# Altium footprint library ICs And Semiconductors THD.PcbLib: 292 footprints (part 15 of 19)
Each footprint in its own frame and in the unit in brackets; x right, y up, seen from the top. Pads: shape width x height; smd on the part's side, far side on the other; paste and mask are expansions set on the pad; w line width, h text height; cw(c..) or ccw(c..) is an arc to the next point about the centre after c.
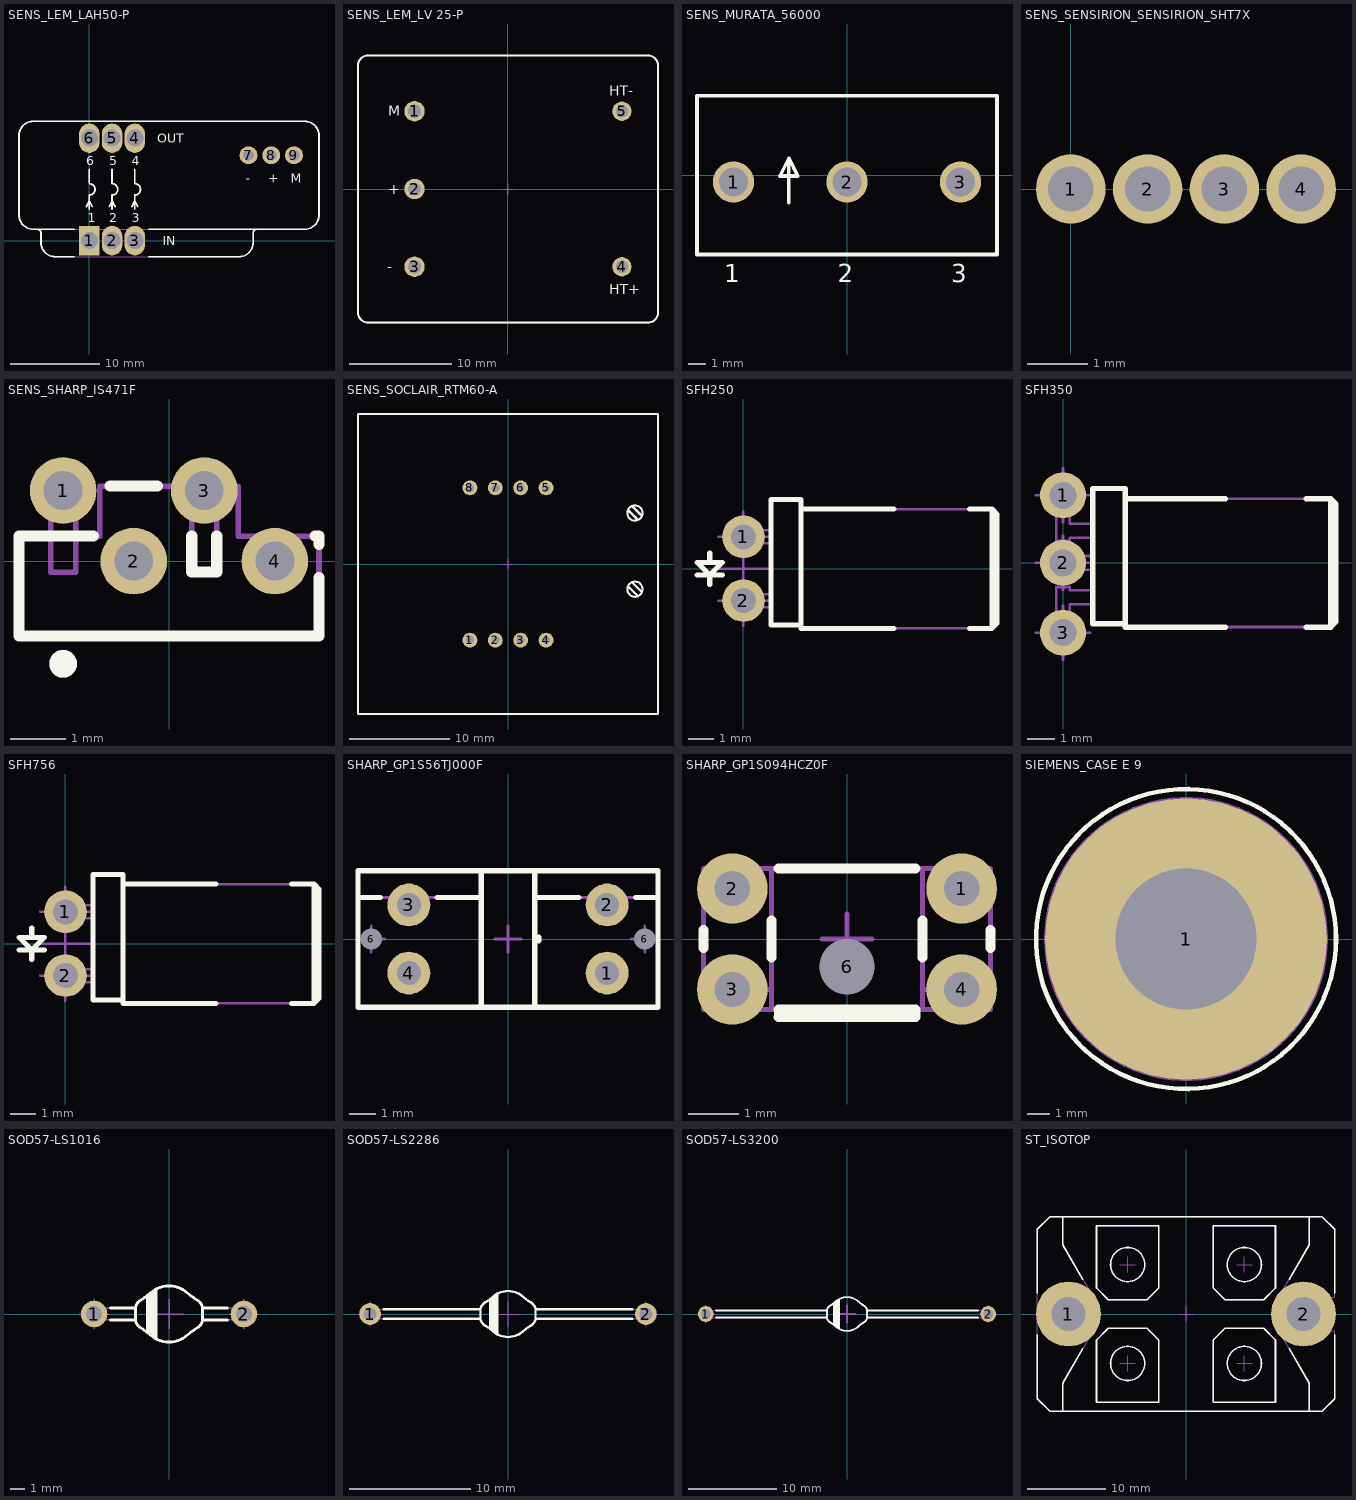
[diagram p14: the footprints below, top view; thin cyan lines are the x and y axes]

## SENS_LEM_LAH50-P [mm] "LEM Current Transducer, Body 33.5X15.13mm (max)"
height 21.2
pads (9):
  rect 2.28x3.3 hole 1.9: 1(0,0)
  oval 2.28x3.3 hole 1.9: 2(2.54,0) 3(5.08,0) 4(5.08,11.43) 5(2.54,11.43) 6(0,11.43)
  round 2 hole 1.2: 7(17.77,9.525) 8(20.31,9.525) 9(22.85,9.525)
Top Overlay:
  lines w0.2: -5.805,1.26 cw(c-5.805,0.86) -5.405,0.86 -5.405,-0.205 ccw(c-3.805,-0.205) -3.805,-1.805 -1.675,-1.805 ; -1.675,1.26 -6.255,1.26 cw(c-6.255,2.86) -7.855,2.86 -7.855,11.725 cw(c-6.255,11.725) -6.255,13.325 24.045,13.325 cw(c24.045,11.725) 25.645,11.725 25.645,2.86 cw(c24.045,2.86) 24.045,1.26 6.65,1.26 ; -0.318,3.81 0,4.445 0.318,3.81 ; 0,3.493 0,5.08 ccw(c0,5.715) 0,6.35 0,7.938 ; 2.222,3.81 2.54,4.445 2.857,3.81 ; 2.54,3.493 2.54,5.08 ccw(c2.54,5.715) 2.54,6.35 2.54,7.938 ; 4.763,3.81 5.08,4.445 5.398,3.81 ; 5.08,3.493 5.08,5.08 ccw(c5.08,5.715) 5.08,6.35 5.08,7.938 ; 6.65,-1.805 16.695,-1.805 ccw(c16.695,-0.205) 18.295,-0.205 18.295,0.86 cw(c18.695,0.86) 18.695,1.26
  text "IN" at 8.223,-0.5 h1.02
  text "OUT" at 7.557,10.93 h1.02
  text "3" at 4.747,2.04 h1.02
  text "4" at 4.747,8.39 h1.02
  text "2" at 2.207,2.04 h1.02
  text "5" at 2.207,8.39 h1.02
  text "1" at -0.167,2.04 h1.02
  text "6" at -0.333,8.39 h1.02
  text "+" at 19.987,6.485 h1.02
  text "-" at 17.447,6.485 h1.02
  text "M" at 22.517,6.485 h1.02
Mechanical 14:
  lines w0.1: -5.805,1.26 cw(c-5.805,0.86) -5.405,0.86 -5.405,-0.205 ccw(c-3.805,-0.205) -3.805,-1.805 16.695,-1.805 ccw(c16.695,-0.205) 18.295,-0.205 18.295,0.86 cw(c18.695,0.86) 18.695,1.26 ; -0.318,3.81 0,4.445 0.318,3.81 ; 0,3.493 0,5.08 ccw(c0,5.715) 0,6.35 0,7.938 ; 2.222,3.81 2.54,4.445 2.857,3.81 ; 2.54,3.493 2.54,5.08 ccw(c2.54,5.715) 2.54,6.35 2.54,7.938 ; 4.763,3.81 5.08,4.445 5.398,3.81 ; 5.08,3.493 5.08,5.08 ccw(c5.08,5.715) 5.08,6.35 5.08,7.938 ; -7.855,2.86 ccw(c-6.255,2.86) -6.255,1.26 24.045,1.26 ccw(c24.045,2.86) 25.645,2.86 25.645,11.725 ccw(c24.045,11.725) 24.045,13.325 -6.255,13.325 ccw(c-6.255,11.725) -7.855,11.725 -7.855,2.86
  text "IN" at 8.223,-0.5 h1.02
  text "OUT" at 7.557,10.93 h1.02
  text "3" at 4.747,2.04 h1.02
  text "4" at 4.747,8.39 h1.02
  text "2" at 2.207,2.04 h1.02
  text "5" at 2.207,8.39 h1.02
  text "1" at -0.167,2.04 h1.02
  text "6" at -0.333,8.39 h1.02
  text "+" at 19.987,6.485 h1.02
  text "-" at 17.447,6.485 h1.02
  text "M" at 22.517,6.485 h1.02
3D body "LAH50-P.stp": height 21, standoff -3.55, extent -7.755,-1.705 25.545,13.225

## SENS_LEM_LV 25-P [mm] "LEM Current Transducer, Body 29.2x26mm"
height 16.45
pads (5):
  round 2 hole 1.3: 1(-9.16,7.62) 2(-9.16,0) 3(-9.16,-7.62)
  round 1.9 hole 1.2: 4(11.16,-7.62) 5(11.16,7.62)
Top Overlay:
  lines w0.2: -14.7,-12.1 ccw(c-13.7,-12.1) -13.7,-13.1 13.7,-13.1 ccw(c13.7,-12.1) 14.7,-12.1 14.7,12.1 ccw(c13.7,12.1) 13.7,13.1 -13.7,13.1 ccw(c-13.7,12.1) -14.7,12.1 -14.7,-12.1
  text "HT+" at 9.915,-10.298 h1
  text "HT-" at 9.909,9.131 h1
  text "-" at -11.832,-8.086 h1
  text "M" at -11.755,7.154 h1
  text "+" at -11.725,-0.5 h1
Notvisible:
  lines w0.1: -9.66,-7.62 -9.16,-7.62 ; -9.66,0 -9.16,0 ; -9.66,7.62 -9.16,7.62 ; -9.16,-8.12 -9.16,-7.62 ; -9.16,-7.12 -9.16,-7.62 ; -9.16,-0.5 -9.16,0 ; -9.16,0.5 -9.16,0 ; -9.16,7.12 -9.16,7.62 ; -9.16,8.12 -9.16,7.62 ; -8.66,-7.62 -9.16,-7.62 ; -8.66,0 -9.16,0 ; -8.66,7.62 -9.16,7.62 ; -0.5,0 0,0 ; 0,-0.5 0,0 ; 0,0.5 0,0 ; 0.5,0 0,0 ; 10.66,-7.62 11.16,-7.62 ; 10.66,7.62 11.16,7.62 ; 11.16,-8.12 11.16,-7.62 ; 11.16,-7.12 11.16,-7.62 ; 11.16,7.12 11.16,7.62 ; 11.16,8.12 11.16,7.62 ; 11.66,-7.62 11.16,-7.62 ; 11.66,7.62 11.16,7.62
Mechanical 14:
  lines w0.1: -14.7,-12.1 ccw(c-13.7,-12.1) -13.7,-13.1 13.7,-13.1 ccw(c13.7,-12.1) 14.7,-12.1 14.7,12.1 ccw(c13.7,12.1) 13.7,13.1 -13.7,13.1 ccw(c-13.7,12.1) -14.7,12.1 -14.7,-12.1
  text "HT+" at 9.915,-10.298 h1
  text "HT-" at 9.909,9.131 h1
  text "+" at -11.725,-0.5 h1
  text "M" at -11.755,7.154 h1
  text "-" at -11.832,-8.086 h1
3D body "SENS_LEM_LV 25-P.stp": height 16.65, standoff -3.2, extent -14.7,-13.1 14.7,13.1

## SENS_MURATA_56000 [mm] "MURATA Current Sensing Transformer, Body 16.79x8.89mm, 5600 Serie"
height 20.19
pads (3):
  round 2.3 hole 1.6: 1(-6.35,-0.386) 2(0,-0.386) 3(6.35,-0.386)
Top Overlay:
  lines w0.2: -3.25,-1.55 -3.25,0.95 ; -3.25,0.95 -2.75,-0.05 -3.75,-0.05 -3.25,0.95 ; -8.395,-4.445 8.395,-4.445 8.395,4.445 -8.395,4.445 -8.395,-4.445
  text "3" at 5.835,-6 h1
  text "2" at -0.515,-6 h1
  text "1" at -6.865,-6 h1
Notvisible:
  lines w0.1: -6.85,-0.386 -6.35,-0.386 ; -6.35,-0.886 -6.35,-0.386 ; -6.35,0.114 -6.35,-0.386 ; -5.85,-0.386 -6.35,-0.386 ; -0.5,-0.386 0,-0.386 ; -0.5,0 0,0 ; 0,-0.886 0,-0.386 ; 0,0.5 0,0 ; 0.5,-0.386 0,-0.386 ; 0.5,0 0,0 ; 5.85,-0.386 6.35,-0.386 ; 6.35,-0.886 6.35,-0.386 ; 6.35,0.114 6.35,-0.386 ; 6.85,-0.386 6.35,-0.386
Mechanical 14:
  lines w0.1: -3.25,-1.55 -3.25,0.95 ; -3.25,0.95 -3.75,-0.05 -2.75,-0.05 -3.25,0.95 ; -8.395,-4.445 8.395,-4.445 8.395,4.445 -8.395,4.445 -8.395,-4.445
  text "3" at 5.835,-6 h1
  text "2" at -0.515,-6 h1
  text "1" at -6.865,-6 h1
3D body "SENS_MURATA_56000.stp": height 20.19, standoff -3.6, extent -8.395,-4.445 8.395,4.445

## SENS_SENSIRION_SENSIRION_SHT7X [mm] "Humidity and Temperature Sensor IC, Body 3.7X13.5mm"
height 13.5
pads (4):
  round 1.15 hole 0.75: 1(0,0) 2(1.27,0) 3(2.54,0) 4(3.81,0)

## SENS_SHARP_IS471F [mm] "SHARP OPIC Light Detector, 4-Leads, Pitch 1.27mm"
height 8.67
pads (4):
  round 1.2 hole 0.7: 1(-1.905,1.27) 2(-0.635,0) 3(0.635,1.27) 4(1.905,0)
Top Overlay:
  circle w0.25: c-1.905,-1.85 r0.125
  lines w0.2: -1.356,0.45 -2.7,0.45 -2.7,-1.35 2.7,-1.35 2.7,-0.301 ; -1.059,1.35 -0.211,1.35 ; 0.41,0.45 0.41,-0.2 0.86,-0.2 0.86,0.45 ; 2.626,0.45 2.7,0.45 2.7,0.301
Mechanical 14:
  circle w0.25: c-1.905,-1.85 r0.125
  lines w0.1: -2.7,-1.35 2.7,-1.35 2.7,0.45 1.25,0.45 1.25,1.35 -1.25,1.35 -1.25,0.45 -2.7,0.45 -2.7,-1.35 ; -2.13,-0.2 -1.68,-0.2 -1.68,1.47 -2.13,1.47 -2.13,-0.2 ; -0.86,-0.2 -0.41,-0.2 -0.41,0.2 -0.86,0.2 -0.86,-0.2 ; 0.41,-0.2 0.86,-0.2 0.86,1.47 0.41,1.47 0.41,-0.2 ; 1.68,-0.2 2.13,-0.2 2.13,0.2 1.68,0.2 1.68,-0.2
3D body "SENS_SHARP_IS471F.stp": height 8.17, standoff -3.35, extent -2.7,-1.35 2.7,1.47

## SENS_SOCLAIR_RTM60-A [mm] "SOCLAIR RTM60 Transducer for Pt-100, Resistors"
height 15
pads (8):
  round 1.5 hole 0.8: 1(-3.81,-7.62) 2(-1.27,-7.62) 3(1.27,-7.62) 4(3.81,-7.62) 5(3.81,7.62) 6(1.27,7.62) 7(-1.27,7.62) 8(-3.81,7.62)
Top Overlay:
  circle w0.2: c12.7,5.1 r0.76
  circle w0.2: c12.7,-2.52 r0.76
  lines w0.2: 12.002,-2.218 13.002,-3.218 ; 12.002,5.402 13.002,4.402 ; 12.398,-1.822 13.398,-2.822 ; 12.398,5.798 13.398,4.798 ; -15,-15 15,-15 15,15 -15,15 -15,-15
Notvisible:
  lines w0.1: -4.31,-7.62 -3.81,-7.62 ; -4.31,7.62 -3.81,7.62 ; -3.81,-8.12 -3.81,-7.62 ; -3.81,-7.12 -3.81,-7.62 ; -3.81,7.12 -3.81,7.62 ; -3.81,8.12 -3.81,7.62 ; -3.31,-7.62 -3.81,-7.62 ; -3.31,7.62 -3.81,7.62 ; -1.77,-7.62 -1.27,-7.62 ; -1.77,7.62 -1.27,7.62 ; -1.27,-8.12 -1.27,-7.62 ; -1.27,-7.12 -1.27,-7.62 ; -1.27,7.12 -1.27,7.62 ; -1.27,8.12 -1.27,7.62 ; -0.77,-7.62 -1.27,-7.62 ; -0.77,7.62 -1.27,7.62 ; -0.5,0 0,0 ; 0,-0.5 0,0 ; 0,0.5 0,0 ; 0.5,0 0,0 ; 0.77,-7.62 1.27,-7.62 ; 0.77,7.62 1.27,7.62 ; 1.27,-8.12 1.27,-7.62 ; 1.27,-7.12 1.27,-7.62 ; 1.27,7.12 1.27,7.62 ; 1.27,8.12 1.27,7.62 ; 1.77,-7.62 1.27,-7.62 ; 1.77,7.62 1.27,7.62 ; 3.31,-7.62 3.81,-7.62 ; 3.31,7.62 3.81,7.62 ; 3.81,-8.12 3.81,-7.62 ; 3.81,-7.12 3.81,-7.62 ; 3.81,7.12 3.81,7.62 ; 3.81,8.12 3.81,7.62 ; 4.31,-7.62 3.81,-7.62 ; 4.31,7.62 3.81,7.62
Mechanical 14:
  circle w0.1: c12.7,5.1 r0.76
  circle w0.1: c12.7,-2.52 r0.76
  lines w0.1: 12.002,-2.218 13.002,-3.218 ; 12.002,5.402 13.002,4.402 ; 12.398,-1.822 13.398,-2.822 ; 12.398,5.798 13.398,4.798 ; -15,-15 15,-15 15,15 -15,15 -15,-15
3D body "SENS_SOCLAIR_RTM60-A.stp": height 15, standoff -3.6, extent -15,-15 15,15

## SFH250 [mm] "Fiber Optic Photodiode Detector"
height 7.55
pads (2):
  round 1.7 hole 1: 1(0,1.27) 2(0,-1.27)
Top Overlay:
  lines w0.2: -1.852,-0.254 -0.836,-0.254 ; -1.344,-0.635 -1.344,-0.254 ; -1.344,0.254 -1.344,0.635 ; 2.3,-2.25 1.1,-2.25 1.1,2.75 2.3,2.75 2.3,-2.375 6,-2.375 ; 2.3,2.375 6,2.375 ; 9,-2.375 9.9,-2.375 ; 9,2.375 9.9,2.375 ; -1.344,-0.254 -1.852,0.254 -0.836,0.254 -1.344,-0.254 ; 9.9,-2.375 10.1,-2.175 10.1,2.175 9.9,2.375 ; 9.9,-2.375 9.9,2.375
Notvisible:
  lines w0.1: -1,-1.27 0,-1.27 ; -1,0 0,0 ; -1,1.27 0,1.27 ; 0,-2.27 0,-1.27 ; 0,-1 0,0 ; 0,-0.27 0,-1.27 ; 0,0.27 0,1.27 ; 0,1 0,0 ; 0,2.27 0,1.27 ; 1,-1.27 0,-1.27 ; 1,0 0,0 ; 1,1.27 0,1.27
Mechanical 14:
  lines w0.1: -1.344,-0.635 -1.344,-0.254 ; -1.344,0.254 -1.344,0.635 ; 1.1,-1.526 -0.25,-1.526 -0.25,-1.014 1.1,-1.014 ; 1.1,1.014 -0.25,1.014 -0.25,1.526 1.1,1.526 ; 2.3,-2.25 1.1,-2.25 1.1,2.75 2.3,2.75 2.3,-2.375 9.9,-2.375 ; 2.3,2.375 9.9,2.375 ; -1.852,-0.254 -0.836,-0.254 ; -1.852,-0.254 -0.836,-0.254 ; -1.852,-0.254 -0.836,-0.254 ; -1.852,0.254 -1.344,-0.254 ; -1.852,0.254 -0.836,0.254 ; -1.852,0.254 -0.836,0.254 ; -1.852,0.254 -1.344,-0.254 ; -1.852,0.254 -1.344,-0.254 ; -1.852,0.254 -0.836,0.254 ; -1.344,-0.254 -0.836,0.254 ; -1.344,-0.254 -0.836,0.254 ; -1.344,-0.254 -0.836,0.254 ; 9.9,-2.375 10.1,-2.175 10.1,2.175 9.9,2.375 ; 9.9,-2.375 9.9,2.375
3D body "SFH250.stp": height 7.55, standoff -3.2, extent -0.25,-2.375 10.1,2.75

## SFH350 [mm] "Fiber Optic Phototransistor Detector"
height 7.55
pads (3):
  round 1.7 hole 1: 1(0,2.498) 2(0,0) 3(0,-2.582)
Top Overlay:
  lines w0.2: 2.3,-2.25 1.1,-2.25 1.1,2.75 2.3,2.75 2.3,-2.375 6,-2.375 ; 2.3,2.375 6,2.375 ; 9,-2.375 9.9,-2.375 ; 9,2.375 9.9,2.375 ; 9.9,-2.375 10.1,-2.175 10.1,2.175 9.9,2.375 ; 9.9,-2.375 9.9,2.375
Notvisible:
  lines w0.1: -1,-2.582 0,-2.582 ; -1,0 0,0 ; -1,2.498 0,2.498 ; 0,-3.582 0,-2.582 ; 0,-1.582 0,-2.582 ; 0,-1 0,0 ; 0,1 0,0 ; 0,1.498 0,2.498 ; 0,3.498 0,2.498 ; 1,-2.582 0,-2.582 ; 1,0 0,0 ; 1,2.498 0,2.498
Mechanical 14:
  lines w0.1: -0.25,-2.326 0.25,-2.326 ; -0.25,-1.526 -0.25,-1.014 ; 1.1,-1.526 0.25,-1.526 0.25,-2.961 -0.25,-2.961 -0.25,-0.891 0.25,-0.891 0.25,-1.014 1.1,-1.014 ; 1.1,-0.256 0.25,-0.256 0.25,-0.379 -0.25,-0.379 -0.25,0.379 0.25,0.379 0.25,0.256 1.1,0.256 ; 1.1,0.93 0.25,0.93 0.25,0.807 -0.25,0.807 -0.25,2.877 0.25,2.877 0.25,1.443 1.1,1.443 ; 2.3,-2.25 1.1,-2.25 1.1,2.75 2.3,2.75 2.3,-2.375 9.9,-2.375 ; 2.3,2.375 9.9,2.375 ; 9.9,-2.375 10.1,-2.175 10.1,2.175 9.9,2.375 ; 9.9,-2.375 9.9,2.375
3D body "SFH350.stp": height 7.54, standoff -3.2, extent -0.25,-2.961 10.1,2.877

## SFH756 [mm] "Fiber Optic Photodiode Detector"
height 7.55
pads (2):
  round 1.7 hole 1: 1(0,1.27) 2(0,-1.27)
Top Overlay:
  lines w0.2: -1.852,-0.254 -0.836,-0.254 ; -1.344,-0.635 -1.344,-0.254 ; -1.344,0.254 -1.344,0.635 ; 2.3,-2.25 1.1,-2.25 1.1,2.75 2.3,2.75 2.3,-2.375 6,-2.375 ; 2.3,2.375 6,2.375 ; 9,-2.375 9.9,-2.375 ; 9,2.375 9.9,2.375 ; -1.344,-0.254 -0.836,0.254 -1.852,0.254 -1.344,-0.254 ; 9.9,-2.375 9.9,2.375 ; 9.9,-2.375 10.1,-2.175 10.1,2.175 9.9,2.375
Notvisible:
  lines w0.1: -1,-1.27 0,-1.27 ; -1,0 0,0 ; -1,1.27 0,1.27 ; 0,-2.27 0,-1.27 ; 0,-1 0,0 ; 0,-0.27 0,-1.27 ; 0,0.27 0,1.27 ; 0,1 0,0 ; 0,2.27 0,1.27 ; 1,-1.27 0,-1.27 ; 1,0 0,0 ; 1,1.27 0,1.27
Mechanical 14:
  lines w0.1: -1.344,-0.635 -1.344,-0.254 ; -1.344,0.254 -1.344,0.635 ; 1.1,-1.526 -0.25,-1.526 -0.25,-1.014 1.1,-1.014 ; 1.1,1.014 -0.25,1.014 -0.25,1.526 1.1,1.526 ; 2.3,-2.25 1.1,-2.25 1.1,2.75 2.3,2.75 2.3,-2.375 9.9,-2.375 ; 2.3,2.375 9.9,2.375 ; -1.852,-0.254 -0.836,-0.254 ; -1.852,-0.254 -0.836,-0.254 ; -1.852,-0.254 -0.836,-0.254 ; -1.852,0.254 -0.836,0.254 ; -1.852,0.254 -1.344,-0.254 ; -1.852,0.254 -1.344,-0.254 ; -1.852,0.254 -0.836,0.254 ; -1.852,0.254 -0.836,0.254 ; -1.852,0.254 -1.344,-0.254 ; -1.344,-0.254 -0.836,0.254 ; -1.344,-0.254 -0.836,0.254 ; -1.344,-0.254 -0.836,0.254 ; 9.9,-2.375 9.9,2.375 ; 9.9,-2.375 10.1,-2.175 10.1,2.175 9.9,2.375
3D body "SFH756.stp": height 7.55, standoff -3.2, extent -0.25,-2.375 10.1,2.75

## SHARP_GP1S56TJ000F [mm] "Gap : 2mm, Slit : 0.15mm Phototransistor Output, Case package Transmissive Photointerrupter"
height 8.2
pads (6):
  round 1.6 hole 0.9: 1(3.7,-1.27) 2(3.7,1.27) 3(-3.7,1.27) 4(-3.7,-1.27)
  round 0.5 hole 0.8 unplated mask+0.15: 6(-5.1,0) 6(5.1,0)
Top Overlay:
  lines w0.2: -5.6,1.55 -4.764,1.55 ; -2.636,1.55 -1,1.55 ; -1,-2.55 -1,2.55 ; 1,-2.55 1,2.55 ; 1,-0.075 1.15,-0.075 1.15,0.075 1,0.075 ; 1,1.55 2.636,1.55 ; 4.764,1.55 5.6,1.55 ; -5.6,-2.55 5.6,-2.55 5.6,2.55 -5.6,2.55 -5.6,-2.55
Notvisible:
  lines w0.1: -5.6,0 -5.1,0 ; -5.1,-0.5 -5.1,0 ; -5.1,0.5 -5.1,0 ; -4.6,0 -5.1,0 ; -4.2,-1.27 -3.7,-1.27 ; -4.2,1.27 -3.7,1.27 ; -3.7,-1.77 -3.7,-1.27 ; -3.7,-0.77 -3.7,-1.27 ; -3.7,0.77 -3.7,1.27 ; -3.7,1.77 -3.7,1.27 ; -3.2,-1.27 -3.7,-1.27 ; -3.2,1.27 -3.7,1.27 ; -0.5,0 0,0 ; 0,-0.5 0,0 ; 0,0.5 0,0 ; 0.5,0 0,0 ; 3.2,-1.27 3.7,-1.27 ; 3.2,1.27 3.7,1.27 ; 3.7,-1.77 3.7,-1.27 ; 3.7,-0.77 3.7,-1.27 ; 3.7,0.77 3.7,1.27 ; 3.7,1.77 3.7,1.27 ; 4.2,-1.27 3.7,-1.27 ; 4.2,1.27 3.7,1.27 ; 4.6,0 5.1,0 ; 5.1,-0.5 5.1,0 ; 5.1,0.5 5.1,0 ; 5.6,0 5.1,0
Mechanical 14:
  lines w0.1: -5.6,1.55 -1,1.55 ; -1,-2.55 -1,2.55 ; 1,-2.55 1,2.55 ; 1,-0.075 1.15,-0.075 1.15,0.075 1,0.075 ; 1,1.55 5.6,1.55 ; -5.6,-2.55 5.6,-2.55 5.6,2.55 -5.6,2.55 -5.6,-2.55
3D body "SHARP_GP1S56TJ000F.stp": height 7.5, standoff -3.6, extent -5.6,-2.55 5.6,2.55

## SHARP_GP1S094HCZ0F [mm] "Gap : 3mm, Slit : 0.3mm Phototransistor Output, Compact Transmissive Photointerrupter"
height 4.8
pads (5):
  round 1.4 hole 0.7: 1(2.275,1) 2(-2.275,1) 3(-2.275,-1) 4(2.275,-1)
  round 1 hole 1.1 unplated mask+0.05: 6(0,-0.55)
Top Overlay:
  lines w0.2: -2.85,-0.182 -2.85,0.182 ; -1.358,-1.4 1.358,-1.4 1.358,-1.55 -1.358,-1.55 -1.35,-1.55 -1.35,-1.4 ; 1.5,-0.368 1.5,0.368 ; -1.5,-0.368 -1.5,0.368 -1.5,-0.368 ; -1.358,1.4 1.358,1.4 -1.358,1.4 ; 2.85,-0.182 2.85,0.182 2.85,-0.182
Notvisible:
  lines w0.1: -2.775,-1 -2.275,-1 ; -2.775,1 -2.275,1 ; -2.275,-1.5 -2.275,-1 ; -2.275,-0.5 -2.275,-1 ; -2.275,0.5 -2.275,1 ; -2.275,1.5 -2.275,1 ; -1.775,-1 -2.275,-1 ; -1.775,1 -2.275,1 ; -0.5,-0.55 0,-0.55 ; -0.5,0 0,0 ; 0,-1.05 0,-0.55 ; 0,0.5 0,0 ; 0.5,-0.55 0,-0.55 ; 0.5,0 0,0 ; 1.775,-1 2.275,-1 ; 1.775,1 2.275,1 ; 2.275,-1.5 2.275,-1 ; 2.275,-0.5 2.275,-1 ; 2.275,0.5 2.275,1 ; 2.275,1.5 2.275,1 ; 2.775,-1 2.275,-1 ; 2.775,1 2.275,1
Mechanical 14:
  lines w0.1: -2.85,-1 -1.5,-1 ; 1.5,-1.4 1.5,1.4 ; 1.5,-1 2.85,-1 ; -2.85,-1.4 -2.85,1.4 ; -2.85,-1.4 2.85,-1.4 ; -2.85,-1.4 -2.85,1.4 ; -2.85,-1.4 2.85,-1.4 ; -2.85,1.4 2.85,1.4 ; -2.85,1.4 2.85,1.4 ; 2.85,-1.4 2.85,1.4 ; 2.85,-1.4 2.85,1.4 ; -1.5,-1.4 -1.5,1.4 -1.5,-1.4
3D body "SHARP_GP1S094HCZ0F.stp": height 4.8, standoff -3.2, extent -2.85,-1.4 2.85,1.4

## SIEMENS_CASE E 9 [mm] "SIEMENS CASE E 9"
height 30.5
pads (1):
  round 12.4 hole 6.2: 1(0,0)
Top Overlay:
  circle w0.2: c0,0 r6.6
Notvisible:
  circle w0.1: c0,0 r6.2
  circle w0.1: c0,0 r3.1
  lines w0.1: -0.5,0 0,0 ; 0,-0.5 0,0 ; 0,0.5 0,0 ; 0.5,0 0,0
Mechanical 14:
  circle w0.1: c0,0 r5.25
  lines w0.1: -1,-0.75 cw(c0,0) 1,-0.75 ; -5.369,-3.1 0,-6.2 5.369,-3.1 5.369,3.1 0,6.2 -5.369,3.1 -5.369,-3.1 ; -1,-2.5 -1,0 cw(c0,0) 1,0 1,-2.5 -1,-2.5
3D body "SIEMENS_CASE E 9_Part1.stp": height 30.5, standoff -11.5, extent -5.989,-5.989 5.989,5.989
3D body "SIEMENS_CASE E 9_Part2.stp": height -2.5, standoff -10.4, extent -6.2,-6.2 6.2,6.2

## SOD57-LS1016 [mm] "Diode, Axial, Body L 4.57 x D 3.81 mm , Pin spacing 10.16mm"
height 2
pads (2):
  round 1.8 hole 1.1: 1(-5.08,0) 2(5.08,0)
Top Overlay:
  lines w0.2: -3.95,-0.4 -2.28,-0.4 ; -3.95,0.4 -2.28,0.4 ; -1.474,-1.244 -1.474,1.244 ; -1.274,-1.41 -1.274,1.41 ; -1.074,-1.568 -1.074,1.568 ; -0.874,-1.689 -0.874,1.689 ; 3.95,-0.4 2.28,-0.4 ; 3.95,0.4 2.28,0.4 ; -2.28,-0.4 ccw(c-1.512,-0.28) -1.883,-0.962 cw(c-2.839,-2.719) -1.681,-1.089 cw(c-4.575,-5.166) -1.26,-1.423 ccw(c0,0) -0.92,-1.663 -0.813,-1.723 ccw(c0,0) 0,-1.905 ccw(c0,0) 0.813,-1.723 0.92,-1.663 ccw(c0,0) 1.26,-1.423 cw(c4.575,-5.166) 1.681,-1.089 cw(c2.839,-2.719) 1.883,-0.962 ccw(c1.512,-0.28) 2.28,-0.4 ; -2.28,-0.4 -2.28,0 -2.28,0.4 ; -2.28,0.4 cw(c-1.512,0.28) -1.883,0.962 ccw(c-2.839,2.719) -1.681,1.089 ccw(c-4.575,5.166) -1.26,1.423 cw(c0,0) -0.92,1.663 -0.813,1.723 cw(c0,0) 0,1.905 cw(c0,0) 0.813,1.723 0.92,1.663 cw(c0,0) 1.26,1.423 ccw(c4.575,5.166) 1.681,1.089 ccw(c2.839,2.719) 1.883,0.962 cw(c1.512,0.28) 2.28,0.4 ; 2.28,-0.4 2.28,0 2.28,0.4
Notvisible:
  lines w0.1: -6.08,0 -5.08,0 ; -5.08,-1 -5.08,0 ; -5.08,1 -5.08,0 ; -4.08,0 -5.08,0 ; -1,0 0,0 ; 0,-1 0,0 ; 0,1 0,0 ; 1,0 0,0 ; 4.08,0 5.08,0 ; 5.08,-1 5.08,0 ; 5.08,1 5.08,0 ; 6.08,0 5.08,0
Mechanical 14:
  lines w0.1: -1.474,-1.244 -1.474,1.244 ; -1.274,-1.41 -1.274,1.41 ; -1.074,-1.568 -1.074,1.568 ; -0.874,-1.689 -0.874,1.689 ; -2.28,-0.4 ccw(c-1.512,-0.28) -1.883,-0.962 cw(c-2.839,-2.719) -1.681,-1.089 cw(c-4.575,-5.166) -1.26,-1.423 ccw(c0,0) -0.92,-1.663 -0.813,-1.723 ccw(c0,0) 0,-1.905 ccw(c0,0) 0.813,-1.723 0.92,-1.663 ccw(c0,0) 1.26,-1.423 cw(c4.575,-5.166) 1.681,-1.089 cw(c2.839,-2.719) 1.883,-0.962 ccw(c1.512,-0.28) 2.28,-0.4 ; -2.28,-0.4 -2.28,0 -2.28,0.4 ; -2.28,-0.4 -5.08,-0.4 cw(c-5.08,0) -5.08,0.4 -2.28,0.4 ; -2.28,0.4 cw(c-1.512,0.28) -1.883,0.962 ccw(c-2.839,2.719) -1.681,1.089 ccw(c-4.575,5.166) -1.26,1.423 cw(c0,0) -0.92,1.663 -0.813,1.723 cw(c0,0) 0,1.905 cw(c0,0) 0.813,1.723 0.92,1.663 cw(c0,0) 1.26,1.423 ccw(c4.575,5.166) 1.681,1.089 ccw(c2.839,2.719) 1.883,0.962 cw(c1.512,0.28) 2.28,0.4 ; 2.28,-0.4 2.28,0 2.28,0.4 ; 2.28,-0.4 5.08,-0.4 ccw(c5.08,0) 5.08,0.4 2.28,0.4
3D body "SOD57-LS1016.stp": height 3.91, standoff -3, extent -5.475,-1.905 5.475,1.905

## SOD57-LS2286 [mm] "Diode, Axial, Body L 4.57 x D 3.81 mm , Pin spacing 22.86mm"
height 2
pads (2):
  round 1.8 hole 1.1: 1(-11.43,0) 2(11.43,0)
Top Overlay:
  lines w0.2: -10.3,-0.4 -2.28,-0.4 ; -10.3,0.4 -2.28,0.4 ; -1.474,-1.244 -1.474,1.244 ; -1.274,-1.41 -1.274,1.41 ; -1.074,-1.568 -1.074,1.568 ; -0.874,-1.689 -0.874,1.689 ; 10.3,-0.4 2.28,-0.4 ; 10.3,0.4 2.28,0.4 ; -2.28,-0.4 ccw(c-1.512,-0.28) -1.883,-0.962 cw(c-2.839,-2.719) -1.681,-1.089 cw(c-4.575,-5.166) -1.26,-1.423 ccw(c0,0) -0.92,-1.663 -0.813,-1.723 ccw(c0,0) 0,-1.905 ccw(c0,0) 0.813,-1.723 0.92,-1.663 ccw(c0,0) 1.26,-1.423 cw(c4.575,-5.166) 1.681,-1.089 cw(c2.839,-2.719) 1.883,-0.962 ccw(c1.512,-0.28) 2.28,-0.4 ; -2.28,-0.4 -2.28,0 -2.28,0.4 ; -2.28,0.4 cw(c-1.512,0.28) -1.883,0.962 ccw(c-2.839,2.719) -1.681,1.089 ccw(c-4.575,5.166) -1.26,1.423 cw(c0,0) -0.92,1.663 -0.813,1.723 cw(c0,0) 0,1.905 cw(c0,0) 0.813,1.723 0.92,1.663 cw(c0,0) 1.26,1.423 ccw(c4.575,5.166) 1.681,1.089 ccw(c2.839,2.719) 1.883,0.962 cw(c1.512,0.28) 2.28,0.4 ; 2.28,-0.4 2.28,0 2.28,0.4
Notvisible:
  lines w0.1: -12.43,0 -11.43,0 ; -11.43,-1 -11.43,0 ; -11.43,1 -11.43,0 ; -10.43,0 -11.43,0 ; -1,0 0,0 ; 0,-1 0,0 ; 0,1 0,0 ; 1,0 0,0 ; 10.43,0 11.43,0 ; 11.43,-1 11.43,0 ; 11.43,1 11.43,0 ; 12.43,0 11.43,0
Mechanical 14:
  lines w0.1: -1.474,-1.244 -1.474,1.244 ; -1.274,-1.41 -1.274,1.41 ; -1.074,-1.568 -1.074,1.568 ; -0.874,-1.689 -0.874,1.689 ; -2.28,-0.4 ccw(c-1.512,-0.28) -1.883,-0.962 cw(c-2.839,-2.719) -1.681,-1.089 cw(c-4.575,-5.166) -1.26,-1.423 ccw(c0,0) -0.92,-1.663 -0.813,-1.723 ccw(c0,0) 0,-1.905 ccw(c0,0) 0.813,-1.723 0.92,-1.663 ccw(c0,0) 1.26,-1.423 cw(c4.575,-5.166) 1.681,-1.089 cw(c2.839,-2.719) 1.883,-0.962 ccw(c1.512,-0.28) 2.28,-0.4 ; -2.28,-0.4 -2.28,0 -2.28,0.4 ; -2.28,-0.4 -11.43,-0.4 cw(c-11.43,0) -11.43,0.4 -2.28,0.4 ; -2.28,0.4 cw(c-1.512,0.28) -1.883,0.962 ccw(c-2.839,2.719) -1.681,1.089 ccw(c-4.575,5.166) -1.26,1.423 cw(c0,0) -0.92,1.663 -0.813,1.723 cw(c0,0) 0,1.905 cw(c0,0) 0.813,1.723 0.92,1.663 cw(c0,0) 1.26,1.423 ccw(c4.575,5.166) 1.681,1.089 ccw(c2.839,2.719) 1.883,0.962 cw(c1.512,0.28) 2.28,0.4 ; 2.28,-0.4 2.28,0 2.28,0.4 ; 2.28,-0.4 11.43,-0.4 ccw(c11.43,0) 11.43,0.4 2.28,0.4
3D body "SOD57-LS2286.stp": height 3.91, standoff -3, extent -11.825,-1.905 11.825,1.905

## SOD57-LS3200 [mm] "Diode, Axial, Body L 4.57 x D 3.81 mm , Pin spacing 32mm"
height 2
pads (2):
  round 1.8 hole 1.1: 1(-16,0) 2(16,0)
Top Overlay:
  lines w0.2: -14.87,-0.4 -2.28,-0.4 ; -14.87,0.4 -2.28,0.4 ; -1.474,-1.244 -1.474,1.244 ; -1.274,-1.41 -1.274,1.41 ; -1.074,-1.568 -1.074,1.568 ; -0.874,-1.689 -0.874,1.689 ; 14.87,-0.4 2.28,-0.4 ; 14.87,0.4 2.28,0.4 ; -2.28,-0.4 ccw(c-1.512,-0.28) -1.883,-0.962 cw(c-2.839,-2.719) -1.681,-1.089 cw(c-4.575,-5.166) -1.26,-1.423 ccw(c0,0) -0.92,-1.663 -0.813,-1.723 ccw(c0,0) 0,-1.905 ccw(c0,0) 0.813,-1.723 0.92,-1.663 ccw(c0,0) 1.26,-1.423 cw(c4.575,-5.166) 1.681,-1.089 cw(c2.839,-2.719) 1.883,-0.962 ccw(c1.512,-0.28) 2.28,-0.4 ; -2.28,-0.4 -2.28,0 -2.28,0.4 ; -2.28,0.4 cw(c-1.512,0.28) -1.883,0.962 ccw(c-2.839,2.719) -1.681,1.089 ccw(c-4.575,5.166) -1.26,1.423 cw(c0,0) -0.92,1.663 -0.813,1.723 cw(c0,0) 0,1.905 cw(c0,0) 0.813,1.723 0.92,1.663 cw(c0,0) 1.26,1.423 ccw(c4.575,5.166) 1.681,1.089 ccw(c2.839,2.719) 1.883,0.962 cw(c1.512,0.28) 2.28,0.4 ; 2.28,-0.4 2.28,0 2.28,0.4
Notvisible:
  lines w0.1: -17,0 -16,0 ; -16,-1 -16,0 ; -16,1 -16,0 ; -15,0 -16,0 ; 15,0 16,0 ; 16,-1 16,0 ; 16,1 16,0 ; 17,0 16,0
  lines w0.2: -1,0 0,0 ; 0,-1 0,0 ; 0,1 0,0 ; 1,0 0,0
Mechanical 14:
  lines w0.1: -2.28,-0.4 -16,-0.4 cw(c-16,0) -16,0.4 -2.28,0.4 ; 2.28,-0.4 16,-0.4 ccw(c16,0) 16,0.4 2.28,0.4
  lines w0.2: -1.474,-1.244 -1.474,1.244 ; -1.274,-1.41 -1.274,1.41 ; -1.074,-1.568 -1.074,1.568 ; -0.874,-1.689 -0.874,1.689 ; -2.28,-0.4 ccw(c-1.512,-0.28) -1.883,-0.962 cw(c-2.839,-2.719) -1.681,-1.089 cw(c-4.575,-5.166) -1.26,-1.423 ccw(c0,0) -0.92,-1.663 -0.813,-1.723 ccw(c0,0) 0,-1.905 ccw(c0,0) 0.813,-1.723 0.92,-1.663 ccw(c0,0) 1.26,-1.423 cw(c4.575,-5.166) 1.681,-1.089 cw(c2.839,-2.719) 1.883,-0.962 ccw(c1.512,-0.28) 2.28,-0.4 2.28,0 2.28,0.4 ccw(c1.512,0.28) 1.883,0.962 cw(c2.839,2.719) 1.681,1.089 cw(c4.575,5.166) 1.26,1.423 ccw(c0,0) 0.92,1.663 0.813,1.723 ccw(c0,0) 0,1.905 ccw(c0,0) -0.813,1.723 -0.92,1.663 ccw(c0,0) -1.26,1.423 cw(c-4.575,5.166) -1.681,1.089 cw(c-2.839,2.719) -1.883,0.962 ccw(c-1.512,0.28) -2.28,0.4 -2.28,0 -2.28,-0.4
3D body "SOD57-LS3200.stp": height 3.91, standoff -3, extent -16.395,-1.905 16.395,1.905

## ST_ISOTOP [mm] "STMicroelectronics isotop Case, Body 38mm x 25.5mm, Tab on PCB Version"
height 12.2
pads (2):
  round 8.35 hole 4.4: 1(-15.1,0) 2(15.1,0)
Top Overlay:
  circle w0.2: c-7.5,6.35 r2.2
  circle w0.2: c7.5,6.35 r2.2
  circle w0.2: c7.5,-6.35 r2.2
  circle w0.2: c-7.5,-6.35 r2.2
  lines w0.2: -19.1,-2.698 -19.1,-10.879 -17.5,-12.479 -15.85,-12.479 ; -19.1,2.698 -19.1,10.879 -17.5,12.479 -15.85,12.479 ; -13.247,-4.455 -15.85,-8.9 -15.85,-12.479 ; -13.247,4.455 -15.85,8.9 -15.85,12.479 ; 13.247,-4.455 15.85,-8.9 15.85,-12.479 ; 13.247,4.455 15.85,8.9 15.85,12.479 ; 19.1,-2.698 19.1,-10.879 17.5,-12.479 15.85,-12.479 ; 19.1,2.698 19.1,10.879 17.5,12.479 15.85,12.479 ; -15.85,-12.479 15.85,-12.479 ; -15.85,12.479 15.85,12.479 ; -11.5,-11.314 -3.5,-11.314 -3.5,-3.342 ; -11.5,-11.314 -11.5,-3.342 ; -11.5,-11.314 -11.5,-3.342 ; -11.5,-3.342 -10,-1.842 ; -11.5,-3.342 -10,-1.842 ; -10,-1.842 -5,-1.842 ; -10,-1.842 -5,-1.842 ; -5,-1.842 -3.5,-3.342 ; -5,-1.842 -3.5,-3.342 ; -11.5,3.342 -10,1.842 -5,1.842 -3.5,3.342 -3.5,11.314 -11.5,11.314 -11.5,3.342 ; 3.5,-11.314 11.5,-11.314 11.5,-3.342 10,-1.842 5,-1.842 3.5,-3.342 3.5,-11.314 ; 3.5,3.342 5,1.842 10,1.842 11.5,3.342 11.5,11.314 3.5,11.314 3.5,3.342
Notvisible:
  lines w0.1: -16.1,0 -15.1,0 ; -15.1,-1 -15.1,0 ; -15.1,1 -15.1,0 ; -14.1,0 -15.1,0 ; -8.5,-6.35 -7.5,-6.35 ; -8.5,6.35 -7.5,6.35 ; -7.5,-7.35 -7.5,-6.35 ; -7.5,-5.35 -7.5,-6.35 ; -7.5,5.35 -7.5,6.35 ; -7.5,7.35 -7.5,6.35 ; -6.5,-6.35 -7.5,-6.35 ; -6.5,6.35 -7.5,6.35 ; -1,0 0,0 ; 0,-1 0,0 ; 0,1 0,0 ; 1,0 0,0 ; 6.5,-6.35 7.5,-6.35 ; 6.5,6.35 7.5,6.35 ; 7.5,-7.35 7.5,-6.35 ; 7.5,-5.35 7.5,-6.35 ; 7.5,5.35 7.5,6.35 ; 7.5,7.35 7.5,6.35 ; 8.5,-6.35 7.5,-6.35 ; 8.5,6.35 7.5,6.35 ; 14.1,0 15.1,0 ; 15.1,-1 15.1,0 ; 15.1,1 15.1,0 ; 16.1,0 15.1,0
Mechanical 14:
  circle w0.1: c-7.5,6.35 r2.2
  circle w0.1: c7.5,6.35 r2.2
  circle w0.1: c7.5,-6.35 r2.2
  circle w0.1: c-7.5,-6.35 r2.2
  circle w0.1: c-15.1,0 r2.15
  lines w0.1: -15.85,-12.479 -17.5,-12.479 -19.1,-10.879 -19.1,10.879 -17.5,12.479 -15.85,12.479 ; -15.85,-12.479 15.85,-12.479 ; -15.85,-12.479 -15.85,-8.9 -11.778,-1.945 ccw(c-15.1,0) -11.778,1.945 -15.85,8.9 -15.85,12.479 ; -15.85,12.479 17.5,12.479 ; -11.5,-11.314 -3.5,-11.314 -3.5,-3.342 ; -11.5,-11.314 -11.5,-3.342 ; -11.5,-11.314 -11.5,-3.342 ; -11.5,-3.342 -10,-1.842 ; -11.5,-3.342 -10,-1.842 ; -10,-1.842 -5,-1.842 ; -10,-1.842 -5,-1.842 ; -5,-1.842 -3.5,-3.342 ; -5,-1.842 -3.5,-3.342 ; 15.85,-12.479 17.5,-12.479 19.1,-10.879 19.1,-2.15 15.1,-2.15 cw(c15.1,0) 15.1,2.15 19.1,2.15 19.1,10.879 17.5,12.479 ; 15.85,-12.479 15.85,-8.9 11.778,-1.945 cw(c15.1,0) 11.778,1.945 15.85,8.9 15.85,12.479 17.5,12.479 ; -11.5,3.342 -10,1.842 -5,1.842 -3.5,3.342 -3.5,11.314 -11.5,11.314 -11.5,3.342 ; 3.5,-11.314 11.5,-11.314 11.5,-3.342 10,-1.842 5,-1.842 3.5,-3.342 3.5,-11.314 ; 3.5,3.342 5,1.842 10,1.842 11.5,3.342 11.5,11.314 3.5,11.314 3.5,3.342
3D body "ISOTOP.stp": height 12.04, standoff 0, extent -19.1,-12.479 19.1,12.479